# Altium footprint library Module1.PcbLib: 24 footprints (part 2 of 2)
Each footprint in its own frame and in the unit in brackets; x right, y up, seen from the top. Pads: shape width x height; smd on the part's side, far side on the other; paste and mask are expansions set on the pad; w line width, h text height; cw(c..) or ccw(c..) is an arc to the next point about the centre after c.
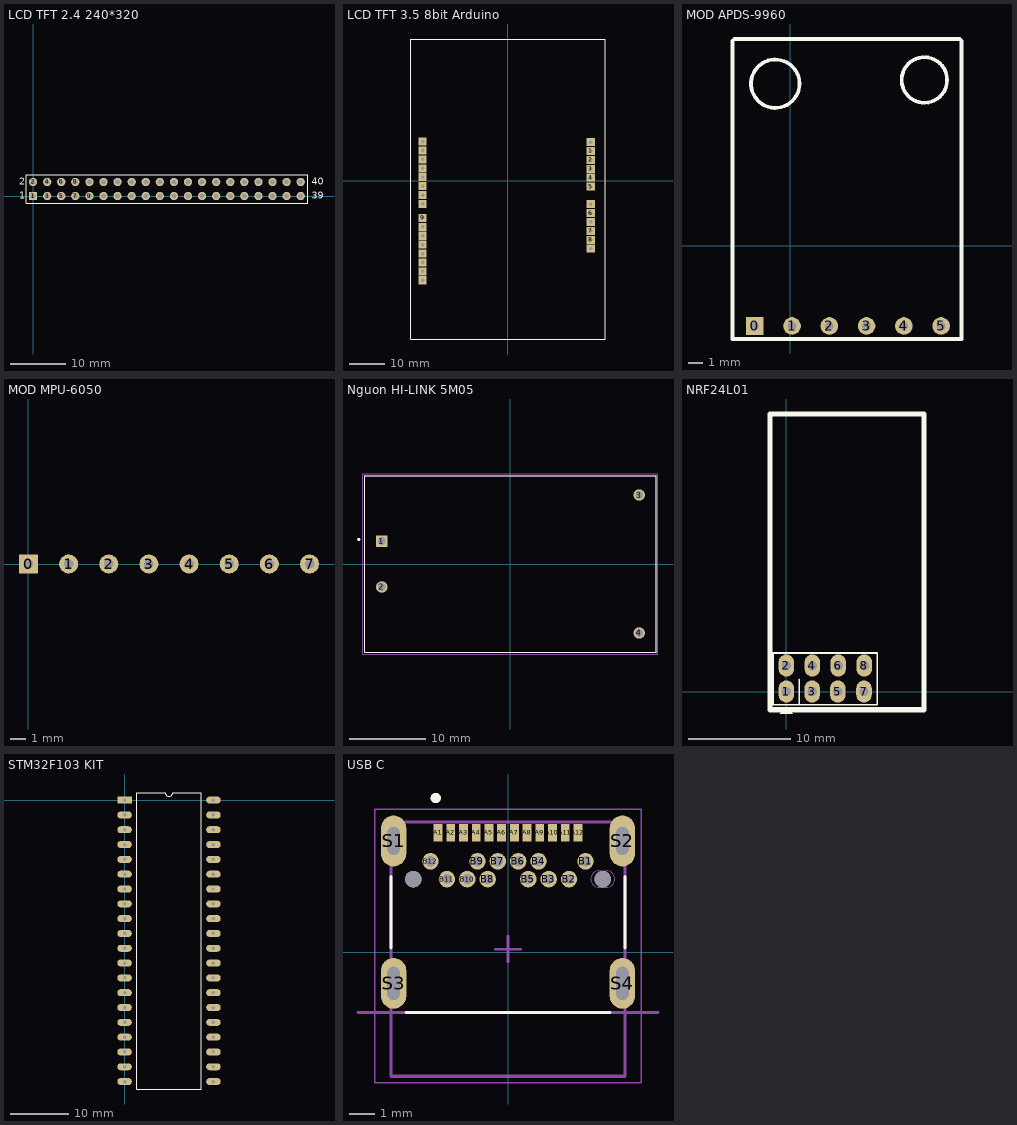
[diagram p1: the footprints below, top view; thin cyan lines are the x and y axes]

## LCD TFT 2.4 240*320 [mm] "Connector; Header; 20x2 Position"
height 1.14
pads (40):
  rect 1.5x1.5 hole 0.9: 1(0,0)
  round 1.5 hole 0.9: 2(0,2.54) 3(2.54,0) 4(2.54,2.54) 5(5.08,0) 6(5.08,2.54) 7(7.62,0) 8(7.62,2.54) 9(10.16,0) 10(10.16,2.54) 11(12.7,0) 12(12.7,2.54) 13(15.24,0) 14(15.24,2.54) 15(17.78,0) 16(17.78,2.54) 17(20.32,0) 18(20.32,2.54) 19(22.86,0) 20(22.86,2.54) 21(25.4,0) 22(25.4,2.54) 23(27.94,0) 24(27.94,2.54) 25(30.48,0) 26(30.48,2.54) 27(33.02,0) 28(33.02,2.54) 29(35.56,0) 30(35.56,2.54) 31(38.1,0) 32(38.1,2.54) 33(40.64,0) 34(40.64,2.54) 35(43.18,0) 36(43.18,2.54) 37(45.72,0) 38(45.72,2.54) 39(48.26,0) 40(48.26,2.54)
Top Overlay:
  lines w0.2: -1.27,-1.27 49.53,-1.27 49.53,3.81 -1.27,3.81 -1.27,-1.27
  text "1" at -2.54,-0.508 h1.27
  text "2" at -2.54,2.032 h1.27
  text "40" at 50.292,2.032 h1.27
  text "39" at 50.292,-0.508 h1.27
3D body "User Library-TFT 3_2 with touch screen.STEP": height 6.02, standoff -8.42, extent -7.881,-89.489 56.119,4.511

## LCD TFT 3.5 8bit Arduino [mm]
pads (28):
  rect 2.3x2.3 hole 1: 1(23.746,8.434) 2(23.746,5.894) 3(23.746,3.354) 4(23.746,0.814) 5(23.746,-1.726) 6(23.746,-9.286) 7(23.746,-14.366) 8(23.746,-16.906) 9(-24.254,-10.666) 10(-24.254,-13.206) 11(-24.254,6.034) 12(-24.254,3.494) 13(-24.254,0.954) 14(-24.254,-1.586) 15(-24.254,-4.126) 16(-24.254,-6.666) 17(-24.254,-15.746) 18(-24.254,-18.286) 19(-24.254,-20.826) 20(-24.254,-23.366) AREF(-24.254,-28.446) GND(23.746,-11.826) GND3(-24.254,-25.906) NC(-24.254,8.574) NC(-24.254,11.114) RESET(23.746,-19.446) RESET(23.746,10.974) Vin(23.746,-6.746)
Top Overlay:
  lines w0.254: -27.686,-45.212 27.94,-45.212 27.94,40.386 -27.686,40.386 -27.686,-45.212
3D body "3.5TFT.STEP": height 14.53, standoff -0.31, extent -27.813,-45.318 27.817,40.492

## MOD APDS-9960 [mm]
pads (6):
  rect 1.2x1.2 hole 0.6: 0(-2.413,-5.461)
  round 1.2 hole 0.6: 1(0.127,-5.461) 2(2.667,-5.461) 3(5.207,-5.461) 4(7.747,-5.461) 5(10.287,-5.461)
Top Overlay:
  circle w0.254: c9.144,11.303 r1.55
  circle w0.254: c-1.016,11.049 r1.651
  lines w0.254: -3.937,13.97 -3.937,-6.35 11.684,-6.35 11.684,13.97 11.557,14.097 -3.81,14.097
3D body "?????? ???????? ??????, ?????, ??????????? APDS-9960.SLDPRT": height 9.47, standoff -1.88, extent -3.813,-6.35 11.687,14.089

## MOD MPU-6050 [mm]
pads (8):
  rect 1.2x1.2 hole 0.6: 0(0,0)
  round 1.2 hole 0.6: 1(2.54,0) 2(5.08,0) 3(7.62,0) 4(10.16,0) 5(12.7,0) 6(15.24,0) 7(17.78,0)
3D body "ITG-MPU.STEP": height 11.03, standoff -0.72, extent -1.987,-1.524 19.513,14.976

## Nguon HI-LINK 5M05 [mm]
pads (4):
  rect 1.5x1.5 hole 1: 1(-16.8,3)
  round 1.5 hole 1: 2(-16.8,-3) 3(16.8,9) 4(16.8,-9)
Top Overlay:
  circle w0.2: c-19.8,3.2 r0.1
  lines w0.127: -19,-11.5 19,-11.5 19,11.5 -19,11.5 -19,-11.5
Mechanical 13:
  circle w0.2: c-19.8,3.2 r0.1
  lines w0.127: -19,-11.5 -19,11.5 19,11.5 19,-11.5 -19,-11.5
Mechanical 15:
  lines w0.05: -19.25,-11.75 -19.25,11.75 19.25,11.75 19.25,-11.75 -19.25,-11.75
3D body "HLK-5M05.stp": height 18.01, standoff -3.1, extent -19.077,-11.5 18.923,11.5

## NRF24L01 [mil]
pads (8):
  oval 60x86 hole 36: 1(0,0) 2(0,100) 3(99,0) 4(100,100) 5(198,0) 6(199.5,100) 7(299,0) 8(300,100)
Top Overlay:
  region: -0.5,-61.5 -25.5,-86.5 24.5,-86.5
  lines w7: 49.5,-50.5 49.5,47.5 ; -51,-51 350,-51 350,149 -51,149 -51,49 -51,-51
  lines w20: -63,-70 530,-70 530,1069.2 -63,1069.2 -63,-70
3D body "User Library-MY-NRF24L01P.STEP": height 587.8, standoff 0.73, extent -73,-73.7 517.55,1068.03

## STM32F103 KIT [mm]
pads (40):
  rect 2.5x1.2 hole 0.6: 1(0,0)
  oval 2.5x1.2 hole 0.6: 2(0,-2.54) 3(0,-5.08) 4(0,-7.62) 5(0,-10.16) 6(0,-12.7) 7(0,-15.24) 8(0,-17.78) 9(0,-20.32) 10(0,-22.86) 11(0,-25.4) 12(0,-27.94) 13(0,-30.48) 14(0,-33.02) 15(0,-35.56) 16(0,-38.1) 17(0,-40.64) 18(0,-43.18) 19(0,-45.72) 20(0,-48.26) 21(15.24,-48.26) 22(15.24,-45.72) 23(15.24,-43.18) 24(15.24,-40.64) 25(15.24,-38.1) 26(15.24,-35.56) 27(15.24,-33.02) 28(15.24,-30.48) 29(15.24,-27.94) 30(15.24,-25.4) 31(15.24,-22.86) 32(15.24,-20.32) 33(15.24,-17.78) 34(15.24,-15.24) 35(15.24,-12.7) 36(15.24,-10.16) 37(15.24,-7.62) 38(15.24,-5.08) 39(15.24,-2.54) 40(15.24,0)
Top Overlay:
  lines w0.2: 2.085,-49.53 2.085,1.27 6.985,1.27 ccw(c7.62,1.27) 8.255,1.27 13.155,1.27 13.155,-49.53 2.085,-49.53
3D body "STM32F103C8T6_Blue_Pill v6.step": height 16.12, standoff -2.15, extent -3.81,-53.966 19.05,3.594

## USB C [mm]
pads (30):
  rect 0.35x0.7 smd: A1(-2.75,4.697) A2(-2.25,4.697) A3(-1.75,4.697) A4(-1.25,4.697) A5(-0.75,4.697) A6(-0.25,4.697) A7(0.25,4.697) A8(0.75,4.697) A9(1.25,4.697) A10(1.75,4.697) A11(2.25,4.697) A12(2.75,4.697)
  round 0.65 hole 0.4: B1(3.05,3.577) B2(2.4,2.877) B3(1.6,2.877) B4(1.2,3.577) B5(0.8,2.877) B6(0.4,3.577) B7(-0.4,3.577) B8(-0.8,2.877) B9(-1.2,3.577) B10(-1.6,2.877) B11(-2.4,2.877) B12(-3.05,3.577)
  oval 1x2 hole 0.5 slot 1.1 at 90 deg: S1(-4.5,4.377) S2(4.5,4.377)
  oval 1x2 hole 0.5 slot 1.3 at 90 deg: S3(-4.5,-1.223) S4(4.5,-1.223)
  round 0.65 hole 0.65 unplated: ""(-3.725,2.877) ""(3.725,2.877)
Top Overlay:
  circle w0.2: c-2.841,6.066 r0.1
  lines w0.127: -4.6,0.177 -4.6,2.977 ; -4,-2.373 4,-2.373 ; 4.6,0.177 4.6,2.977
Mechanical 1:
  lines w0: 3.25,2.877 cw(c3.575,2.877) 3.575,3.202 3.875,3.202 cw(c3.875,2.877) 4.2,2.877 cw(c3.875,2.877) 3.875,2.552 3.575,2.552 cw(c3.575,2.877) 3.25,2.877
Mechanical 13:
  circle w0.2: c-2.849,6.064 r0.1
  lines w0.1: -0.5,0.127 0.5,0.127 ; 0,-0.373 0,0.627
  lines w0.127: -5.9,-2.373 5.9,-2.373 ; -4.6,-4.873 4.6,-4.873 4.6,5.127 -4.6,5.127 -4.6,-4.873
Mechanical 15:
  lines w0.05: -5.25,-5.123 5.25,-5.123 5.25,5.627 -5.25,5.627 -5.25,-5.123
3D body "usb4055-30-a.SLDPRT": height 3.52, standoff -1.14, extent -4.835,-4.898 4.877,5.102